# Altium footprint library CeleronLib_THD.PcbLib: 217 footprints (part 14 of 14)
Each footprint in its own frame and in the unit in brackets; x right, y up, seen from the top. Pads: shape width x height; smd on the part's side, far side on the other; paste and mask are expansions set on the pad; w line width, h text height; cw(c..) or ccw(c..) is an arc to the next point about the centre after c.
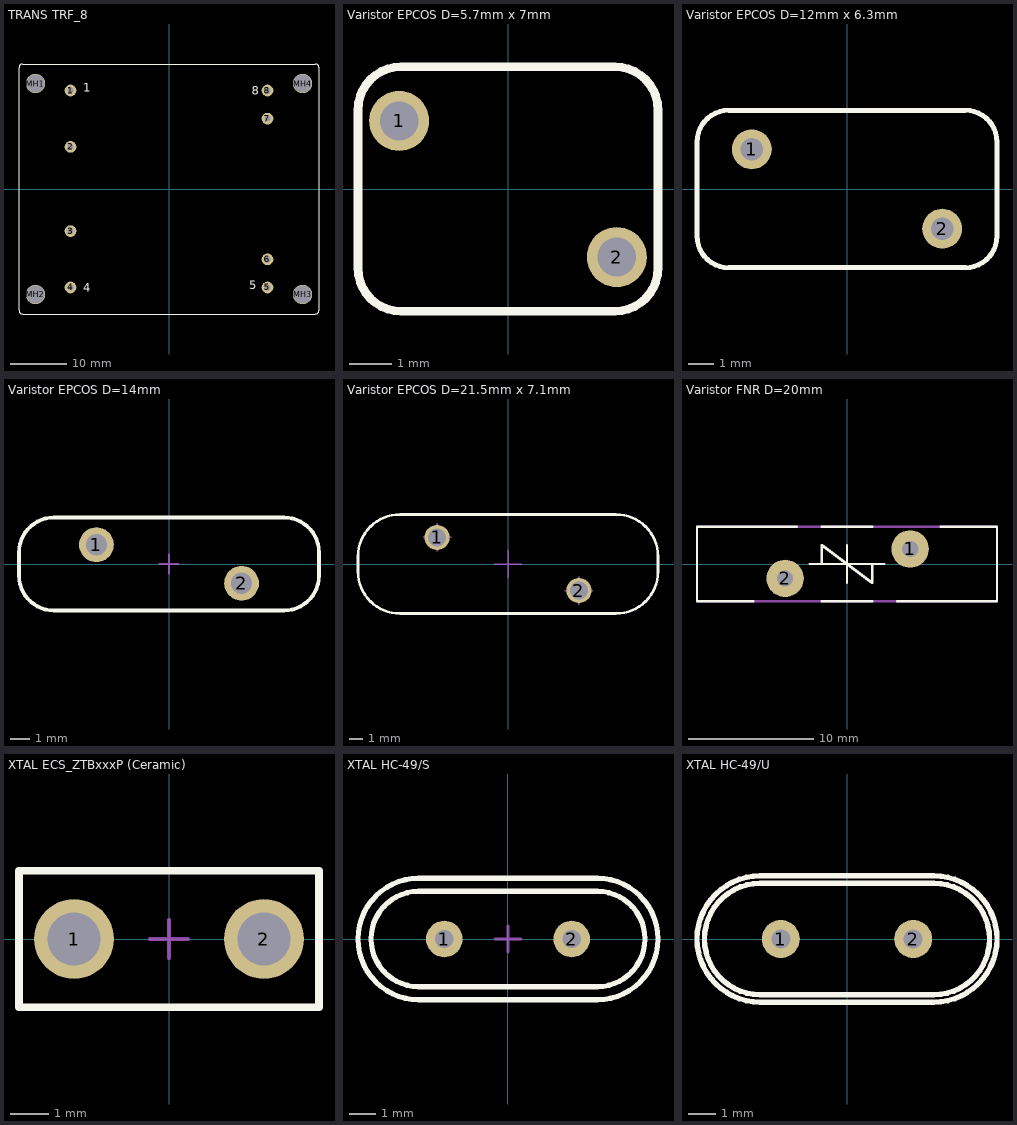
[diagram p13: the footprints below, top view; thin cyan lines are the x and y axes]

## TRANS TRF_8 [mil] "Transformer; 8 Leads"
pads (12):
  round 82 hole 42: 1(-689.17,689.17) 2(-689.17,295) 3(-689.17,-295) 4(-689.17,-689.17) 5(689.17,-689.17) 6(689.17,-492.5) 7(689.17,492.5) 8(689.17,689.17)
  round 135 hole 125: MH1(-935,738.33) MH2(-935,-738.33) MH3(935,-738.33) MH4(935,738.33)
Top Overlay:
  lines w8: -1050,-850 ccw(c-1025,-850) -1025,-875 1025,-875 ccw(c1025,-850) 1050,-850 1050,850 ccw(c1025,850) 1025,875 -1025,875 ccw(c-1025,850) -1050,850 -1050,-850
  text "4" at -600,-720 h59.06
  text "8" at 580,660 h59.06
  text "5" at 560,-700 h59.06
  text "1" at -600,680 h59.06

## Varistor EPCOS D=5.7mm x 7mm [mm] "EPCOS S05K460 Metal Oxyde Varistor, Body 7x5.7mm"
height 9
pads (2):
  round 1.4 hole 0.9: 1(-2.54,1.587) 2(2.54,-1.587)
Top Overlay:
  lines w0.2: -3.5,-1.85 ccw(c-2.5,-1.85) -2.5,-2.85 2.5,-2.85 ccw(c2.5,-1.85) 3.5,-1.85 3.5,1.85 ccw(c2.5,1.85) 2.5,2.85 -2.5,2.85 ccw(c-2.5,1.85) -3.5,1.85 -3.5,-1.85
Top Assy:
  lines w0.1: -3.5,-1.85 ccw(c-2.5,-1.85) -2.5,-2.85 2.5,-2.85 ccw(c2.5,-1.85) 3.5,-1.85 3.5,1.85 ccw(c2.5,1.85) 2.5,2.85 -2.5,2.85 ccw(c-2.5,1.85) -3.5,1.85 -3.5,-1.85
3D body: height 9, standoff -3.6, extent -3.508,-2.858 3.492,2.842

## Varistor EPCOS D=12mm x 6.3mm [mm] "EPCOS S10K460 Metal Oxyde Varistor, Body 6.3X12mm"
height 15
pads (2):
  round 1.6 hole 0.9: 1(-3.81,1.587) 2(3.81,-1.587)
Top Overlay:
  lines w0.2: 4.73,-3.15 ccw(c4.73,-1.88) 6,-1.88 6,1.88 ccw(c4.73,1.88) 4.73,3.15 -4.73,3.15 ccw(c-4.73,1.88) -6,1.88 -6,-1.88 ccw(c-4.73,-1.88) -4.73,-3.15 4.75,-3.15
Top Assy:
  lines w0.1: -6,-1.88 ccw(c-4.73,-1.88) -4.73,-3.15 4.73,-3.15 ccw(c4.73,-1.88) 6,-1.88 6,1.88 ccw(c4.73,1.88) 4.73,3.15 -4.73,3.15 ccw(c-4.73,1.88) -6,1.88 -6,-1.88
3D body: height 15, standoff -3.6, extent -6,-3.15 6,3.15

## Varistor EPCOS D=14mm [mm] "EPCOS B72214S0251K101 Metal Oxyde Varistor, 14mm Body Diameter"
height 18.5
pads (2):
  round 1.8 hole 1.1: 1(-3.75,1) 2(3.75,-1)
Top Overlay:
  lines w0.2: -7.75,-0.6 ccw(c-5.95,-0.6) -5.95,-2.4 5.95,-2.4 ccw(c5.95,-0.6) 7.75,-0.6 7.75,0.6 ccw(c5.95,0.6) 5.95,2.4 -5.95,2.4 ccw(c-5.95,0.6) -7.75,0.6 -7.75,-0.6
Mechanical 8:
  lines w0.1: -4.25,1 -3.75,1 ; -3.75,0.5 -3.75,1 ; -3.75,1.5 -3.75,1 ; -3.25,1 -3.75,1 ; -0.5,0 0,0 ; 0,-0.5 0,0 ; 0,0.5 0,0 ; 0.5,0 0,0 ; 3.25,-1 3.75,-1 ; 3.75,-1.5 3.75,-1 ; 3.75,-0.5 3.75,-1 ; 4.25,-1 3.75,-1
Top Assy:
  lines w0.1: -7.75,-0.6 ccw(c-5.95,-0.6) -5.95,-2.4 5.95,-2.4 ccw(c5.95,-0.6) 7.75,-0.6 7.75,0.6 ccw(c5.95,0.6) 5.95,2.4 -5.95,2.4 ccw(c-5.95,0.6) -7.75,0.6 -7.75,-0.6
3D body: height 18.5, standoff -3.6, extent -7.75,-2.4 7.75,2.4

## Varistor EPCOS D=21.5mm x 7.1mm [mm] "EPCOS B72220S0511K101 Metal Oxyde Varistor, Body 7.1X21.5mm"
height 26
pads (2):
  round 1.8 hole 1.3: 1(-5.08,1.905) 2(5.08,-1.905)
Top Overlay:
  lines w0.2: -10.75,-0.55 ccw(c-7.75,-0.55) -7.75,-3.55 7.75,-3.55 ccw(c7.75,-0.55) 10.75,-0.55 10.75,0.55 ccw(c7.75,0.55) 7.75,3.55 -7.75,3.55 ccw(c-7.75,0.55) -10.75,0.55 -10.75,-0.55
Mechanical 8:
  lines w0.1: -6.08,1.905 -5.08,1.905 ; -5.08,0.905 -5.08,1.905 ; -5.08,2.905 -5.08,1.905 ; -4.08,1.905 -5.08,1.905 ; -1,0 0,0 ; 0,-1 0,0 ; 0,1 0,0 ; 1,0 0,0 ; 4.08,-1.905 5.08,-1.905 ; 5.08,-2.905 5.08,-1.905 ; 5.08,-0.905 5.08,-1.905 ; 6.08,-1.905 5.08,-1.905
3D body: height 26, standoff -2.1, extent -10.75,-3.55 10.75,3.55

## Varistor FNR D=20mm [mm] "Варистор Series FNR D=20mm, d=1mm, W=10(+-1mm), Tmax= 5.5 mm"
height 0.635
pads (2):
  round 3 hole 1.3: 1(5.05,1.2) 2(-4.95,-1.15)
Top Overlay:
  lines w0.2: -7.5,-3 -12,-3 -12,3 -4,3 ; -3,0 3,0 ; -2,-3 2,-3 ; -2,0 -2,1.5 2,-1.5 2,0 ; -2,3 2,3 ; 0,-1.5 0,1.5 ; 4,-3 12,-3 12,3 7.5,3
Top Courtyard:
  lines w0.2: -1,0 1.1,0 ; 0,-1 0,1 ; -12,-3 -12,3 12,3 12,-3 -12,-3
3D body: height 27.75, standoff -3.5, extent -10.75,-2.61 10.75,2.6

## XTAL ECS_ZTBxxxP (Ceramic) [mm] "ZTB Serie Leaded Ceramic Resonator, Body L 7.9 x W 3.6mm H 9.3, Pitch 5mm"
height 9.3
pads (2):
  round 2.1 hole 1.4: 1(-2.5,0) 2(2.5,0)
Top Overlay:
  lines w0.2: -3.95,-1.8 -3.95,1.8 3.95,1.8 3.95,-1.8 -3.95,-1.8
Mechanical 8:
  lines w0.1: -3,0 -2.5,0 ; -2.5,-0.5 -2.5,0 ; -2.5,0.5 -2.5,0 ; -2,0 -2.5,0 ; -0.5,0 0,0 ; 0,-0.5 0,0 ; 0,0.5 0,0 ; 0.5,0 0,0 ; 2,0 2.5,0 ; 2.5,-0.5 2.5,0 ; 2.5,0.5 2.5,0 ; 3,0 2.5,0
Top Assy:
  lines w0.1: -3.95,-1.8 3.95,-1.8 3.95,1.8 -3.95,1.8 -3.95,-1.8
3D body: height 9.3, standoff -3.6, extent -3.95,-1.8 3.95,1.8

## XTAL HC-49/S [mm] "HC-49/S Leaded Cristal, Body 11.05x4.8mm; Pitch 4.88mm"
height 3.5
pads (2):
  round 1.4 hole 0.7: 1(-2.44,0) 2(2.44,0)
Top Overlay:
  lines w0.2: -5.75,0 ccw(c-3.42,0) -3.42,-2.33 3.42,-2.33 ccw(c3.42,0) 5.75,0 ccw(c3.42,0) 3.42,2.33 -3.42,2.33 ccw(c-3.42,0) -5.75,0 ; -5.25,0 ccw(c-3.42,0) -3.42,-1.83 3.42,-1.83 ccw(c3.42,0) 5.25,0 ccw(c3.42,0) 3.42,1.83 -3.42,1.83 ccw(c-3.42,0) -5.25,0
Mechanical 8:
  lines w0.1: -2.94,0 -2.44,0 ; -2.44,-0.5 -2.44,0 ; -2.44,0.5 -2.44,0 ; -1.94,0 -2.44,0 ; -0.5,0 0,0 ; 0,-0.5 0,0 ; 0,0.5 0,0 ; 0.5,0 0,0 ; 1.94,0 2.44,0 ; 2.44,-0.5 2.44,0 ; 2.44,0.5 2.44,0 ; 2.94,0 2.44,0
Top Assy:
  lines w0.1: -5.75,0 ccw(c-3.42,0) -3.42,-2.33 3.42,-2.33 ccw(c3.42,0) 5.75,0 ccw(c3.42,0) 3.42,2.33 -3.42,2.33 ccw(c-3.42,0) -5.75,0 ; -5.25,0 ccw(c-3.42,0) -3.42,-1.83 3.42,-1.83 ccw(c3.42,0) 5.25,0 ccw(c3.42,0) 3.42,1.83 -3.42,1.83 ccw(c-3.42,0) -5.25,0
3D body: height 3.5, standoff -3.6, extent -5.75,-2.33 5.75,2.33

## XTAL HC-49/U [mm] "HC-49/U Leaded Cristal, Body 11.5x4.66mm; Pitch 4.88mm"
height 13.6
pads (2):
  round 1.4 hole 0.7: 1(-2.44,0) 2(2.44,0)
Top Overlay:
  lines w0.2: -3.2,-2.325 cw(c-3.2,0) -3.2,2.325 3.2,2.325 cw(c3.2,0) 3.2,-2.325 -3.2,-2.325 ; -3.2,-2.05 cw(c-3.2,0) -3.2,2.05 3.2,2.05 cw(c3.2,0) 3.2,-2.05 -3.2,-2.05
Top Assy:
  lines w0.1: -3.2,-2.325 cw(c-3.2,0) -3.2,2.325 3.2,2.325 cw(c3.2,0) 3.2,-2.325 -3.2,-2.325 ; -3.2,-2.05 cw(c-3.2,0) -3.2,2.05 3.2,2.05 cw(c3.2,0) 3.2,-2.05 -3.2,-2.05
3D body: height 13.6, standoff -3.6, extent -5.525,-2.4 5.525,2.4